# Altium footprint library SOT SOD TO DAPK.PcbLib: 156 footprints (part 2 of 10)
Each footprint in its own frame and in the unit in brackets; x right, y up, seen from the top. Pads: shape width x height; smd on the part's side, far side on the other; paste and mask are expansions set on the pad; w line width, h text height; cw(c..) or ccw(c..) is an arc to the next point about the centre after c.
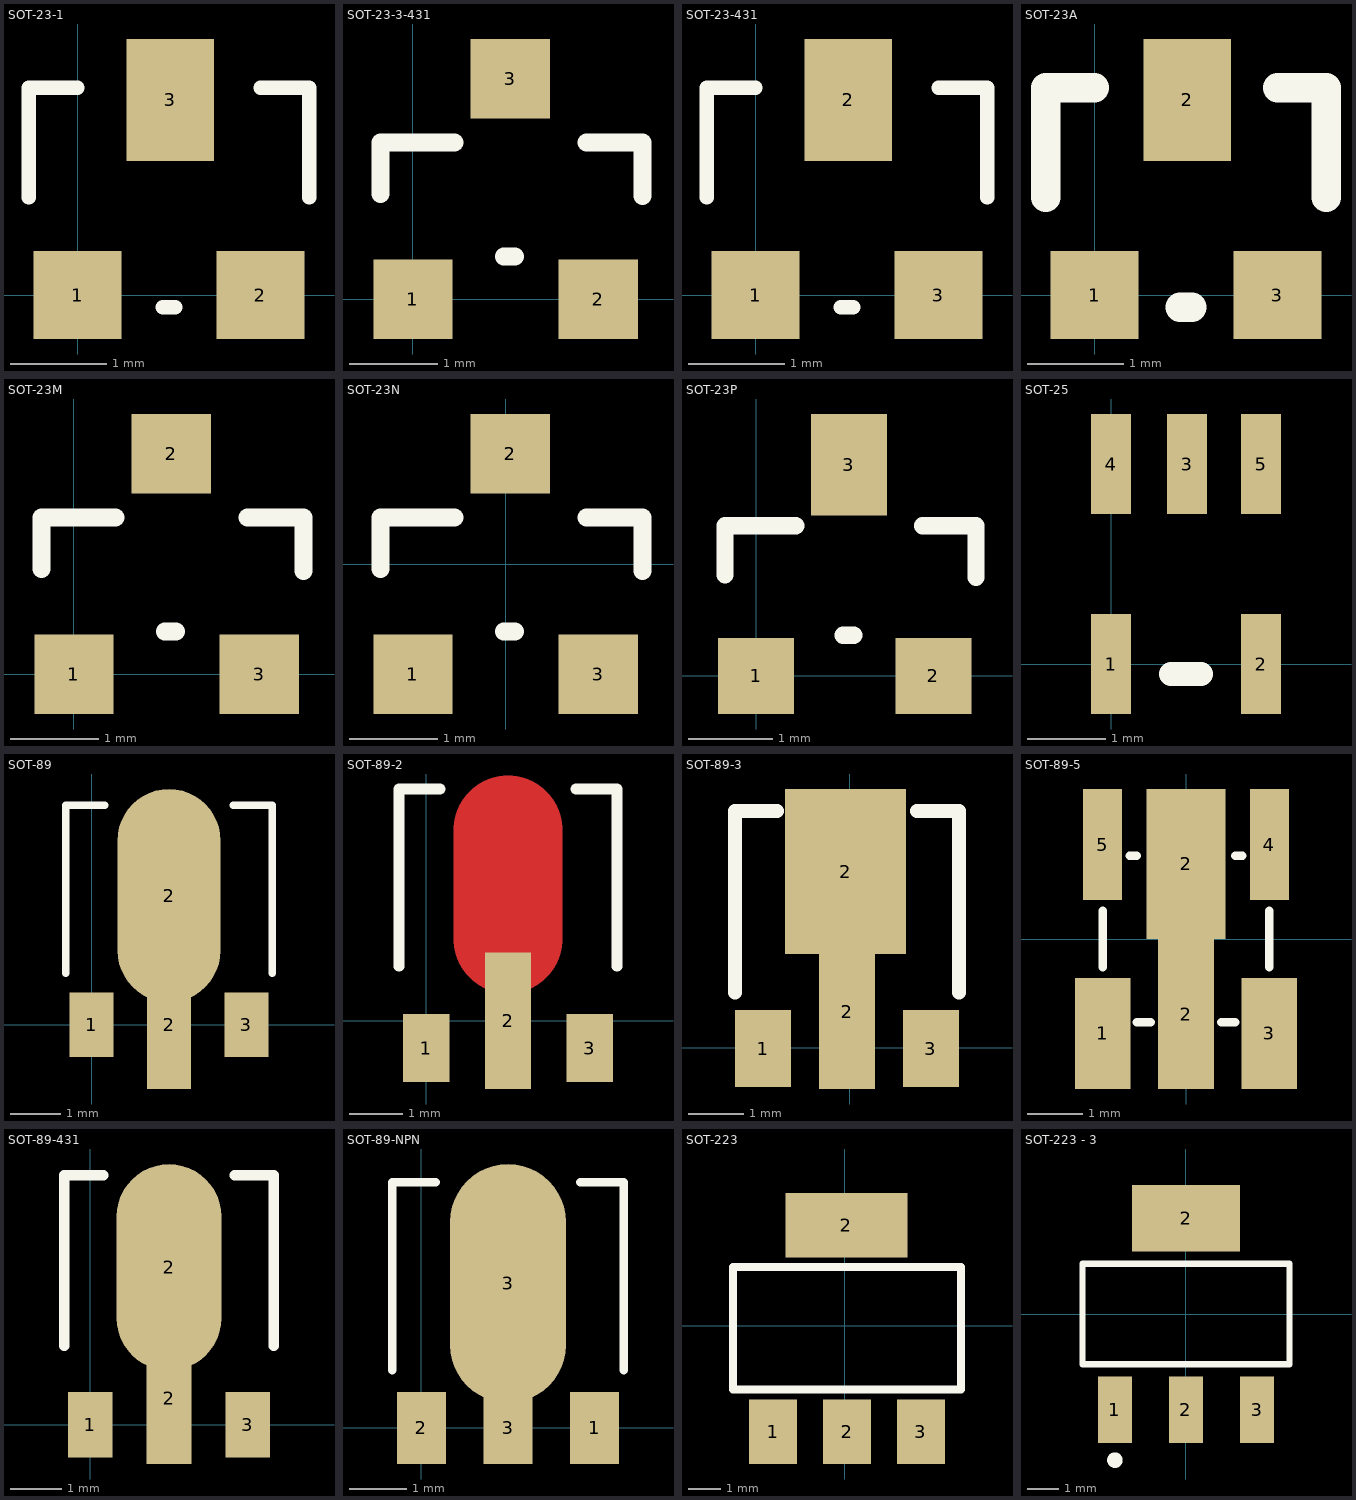
[diagram p1: the footprints below, top view; thin cyan lines are the x and y axes]

## SOT-23-1 [mil]
pads (3):
  rect 35.98x35.98 smd: 1(0,0) 2(75,0)
  rect 36x50 smd: 3(38,80)
Top Overlay:
  lines w5.91: -20,40 -20,85 0,85 ; 35,-5 40,-5 ; 75,85 95,85 95,40
3D body "SOT-23-3.STEP": height 47.24, standoff 0, extent -22.09,-10.12 92.09,100.12

## SOT-23-3-431 [mm]
pads (3):
  rect 0.9x0.9 smd: 1(0,0) 2(2.1,0) 3(1.1,2.5)
Top Overlay:
  lines w0.203: -0.368,1.194 -0.368,1.778 0.47,1.778 ; 1.029,0.483 1.156,0.483 ; 1.968,1.778 2.603,1.778 2.603,1.168
3D body "SOT-23-3.STEP": height 1.2, standoff 0, extent -0.378,-0.153 2.522,2.647

## SOT-23-431 [mil]
pads (3):
  rect 35.98x35.98 smd: 1(0,0) 3(75,0)
  rect 35.98x50 smd: 2(37.99,80)
Top Overlay:
  lines w5.91: -20,40 -20,85 0,85 ; 35,-5 40,-5 ; 75,85 95,85 95,40
3D body "SOT-23-3.STEP": height 47.24, standoff 0, extent -19.87,-16.02 94.3,94.22

## SOT-23A [mil]
pads (3):
  rect 36x36 smd: 1(0,0) 3(75,0)
  rect 36x50 smd: 2(38,80)
Top Overlay:
  lines w12: -20,40 -20,85 0,85 ; 35,-5 40,-5 ; 75,85 95,85 95,40
3D body "SOT-23-3.STEP": height 47.24, standoff 0, extent -19.87,-11.02 94.3,99.22

## SOT-23M [mm]
pads (3):
  rect 0.9x0.9 smd: 1(0,0) 2(1.1,2.5) 3(2.1,0)
Top Overlay:
  lines w0.203: -0.368,1.194 -0.368,1.778 0.47,1.778 ; 1.029,0.483 1.156,0.483 ; 1.968,1.778 2.603,1.778 2.603,1.168
3D body "SOT-23-3.STEP": height 1.2, standoff 0, extent -0.378,-0.153 2.522,2.647

## SOT-23N [mm]
pads (3):
  rect 0.9x0.9 smd: 1(-1.05,-1.25) 2(0.05,1.25) 3(1.05,-1.25)
Top Overlay:
  lines w0.203: -1.418,-0.056 -1.418,0.528 -0.58,0.528 ; -0.021,-0.767 0.106,-0.767 ; 0.919,0.528 1.554,0.528 1.554,-0.082
3D body "SOT-23-3.STEP": height 1.2, standoff 0, extent -1.45,-1.4 1.45,1.4

## SOT-23P [mm]
pads (3):
  rect 0.9x0.9 smd: 1(0,0) 2(2.1,0)
  rect 0.9x1.2 smd: 3(1.1,2.5)
Top Overlay:
  lines w0.203: -0.368,1.194 -0.368,1.778 0.47,1.778 ; 1.029,0.483 1.156,0.483 ; 1.968,1.778 2.603,1.778 2.603,1.168
3D body "SOT-23-3.STEP": height 1.2, standoff 0, extent -0.378,-0.153 2.522,2.647

## SOT-25 [mil]
pads (5):
  rect 20x50 smd: 1(0,0) 2(75,0) 3(38,100) 4(0,100) 5(75,100)
Top Overlay:
  lines w12: 30,-5 45,-5

## SOT-89 [mil]
pads (4):
  rect 34.02x50 smd: 1(0,0) 3(120,0)
  rect 34x100 smd: 2(60,0)
  oval 80x165.35 smd: 2(60,100)
Top Overlay:
  lines w5.91: -20,40 -20,170 10,170 ; 110,170 140,170 140,40
3D body "SW3dPS-SOT89.STEP": height 62.57, standoff -0.76, extent -30.55,-16.65 150.55,150.67

## SOT-89-2 [mil]
pads (3):
  rect 34x50 smd: 1(0,-20) 3(120,-20)
  rect 34x100 smd: 2(60,0)
Top Layer:
  lines w80: 60,60 60,140
Top Overlay:
  lines w8: -20,40 -20,170 10,170 ; 110,170 140,170 140,40
Top Solder:
  lines w80: 60,60 60,140
3D body "User Library-SOT-89-2.STEP": height 55.12, standoff 0, extent -30,-30 147.17,124.92

## SOT-89-3 [mil]
pads (4):
  rect 40x55 smd: 1(-61.82,-0.57) 3(58.18,-0.57)
  rect 86.61x118.11 smd: 2(-2.76,125.98)
  rect 40x110.24 smd: 2(-1.82,25.59)
Top Overlay:
  lines w10: -81.82,39.43 -81.82,169.43 -51.82,169.43 ; 48.18,169.43 78.18,169.43 78.18,39.43
3D body "SOT-89.STEP": height 59.45, standoff 0, extent -90.07,-6.45 87.1,162.85

## SOT-89-5 [mm]
pads (6):
  rect 1x2 smd: 1(-1.5,-1.7) 3(1.5,-1.7)
  rect 1x2.7 smd: 2(0,-1.35)
  rect 1.422x2.7 smd: 2(0,1.35)
  rect 0.7x2 smd: 4(1.5,1.7) 5(-1.5,1.7)
Top Overlay:
  lines w0.15: -1.5,-0.508 -1.5,0.508 ; -1.016,1.5 -0.889,1.5 ; -0.889,-1.5 -0.635,-1.5 ; 0.635,-1.5 0.889,-1.5 ; 0.889,1.5 1.016,1.5 ; 1.5,-0.508 1.5,0.508
3D body "SW3dPS-SOT895-A-PKG.STEP": height 1.2, standoff -0.3, extent -2.25,-1.9 2.25,1.9

## SOT-89-431 [mil]
pads (4):
  rect 34x50 smd: 1(0,0) 3(120,0)
  rect 34x100 smd: 2(60,20)
  oval 79.92x157.48 smd: 2(60,120)
Top Overlay:
  lines w8: -20,60 -20,190 10,190 ; 110,190 140,190 140,60
3D body "User Library-SOT-89-2.STEP": height 55.12, standoff 0, extent -25,2.54 152.17,157.46

## SOT-89-NPN [mil]
pads (4):
  rect 34.02x50 smd: 1(120,0) 2(0,0)
  rect 34x50 smd: 3(60,0)
  oval 80x165.35 smd: 3(60,100)
Top Overlay:
  lines w5.91: -20,40 -20,170 10,170 ; 110,170 140,170 140,40
3D body "SW3dPS-SOT89.STEP": height 62.57, standoff -0.76, extent -30.55,-16.65 150.55,150.67

## SOT-223 [mil]
pads (4):
  rect 59x79 smd: 1(-88,-130) 2(2.55,-130) 3(93.1,-130)
  rect 150x79 smd: 2(1.88,123.54)
Top Overlay:
  lines w10: -137.45,-78 142.55,-78 142.55,72 -137.45,72 -137.45,-78
3D body "SOT-223_MP04A.STEP": height 66.93, standoff 0, extent -126.41,-138.72 129.5,135.3

## SOT-223 - 3 [mm] "SOT-223/SC-73; 4 Leads; Body 6.7 x 7.3 mm, inc. leads (LxW max)"
height 1.78
pads (4):
  rect 1.1x2.15 smd: 1(-2.3,-3.1) 2(0,-3.1) 3(2.3,-3.1)
  rect 3.5x2.15 smd: 2(0,3.1)
Top Overlay:
  circle w0.25: c-2.3,-4.725 r0.125
  lines w0.2: -3.35,-1.625 3.35,-1.625 3.35,1.625 -3.35,1.625 -3.35,-1.625
3D body "User Library-SOT223-3.step": height 1.7, standoff 0, extent -3.25,-3.627 3.25,3.373